# Altium footprint library Zynq-Video-Board.PcbLib: 39 footprints (part 3 of 3)
Each footprint in its own frame and in the unit in brackets; x right, y up, seen from the top. Pads: shape width x height; smd on the part's side, far side on the other; paste and mask are expansions set on the pad; w line width, h text height; cw(c..) or ccw(c..) is an arc to the next point about the centre after c.
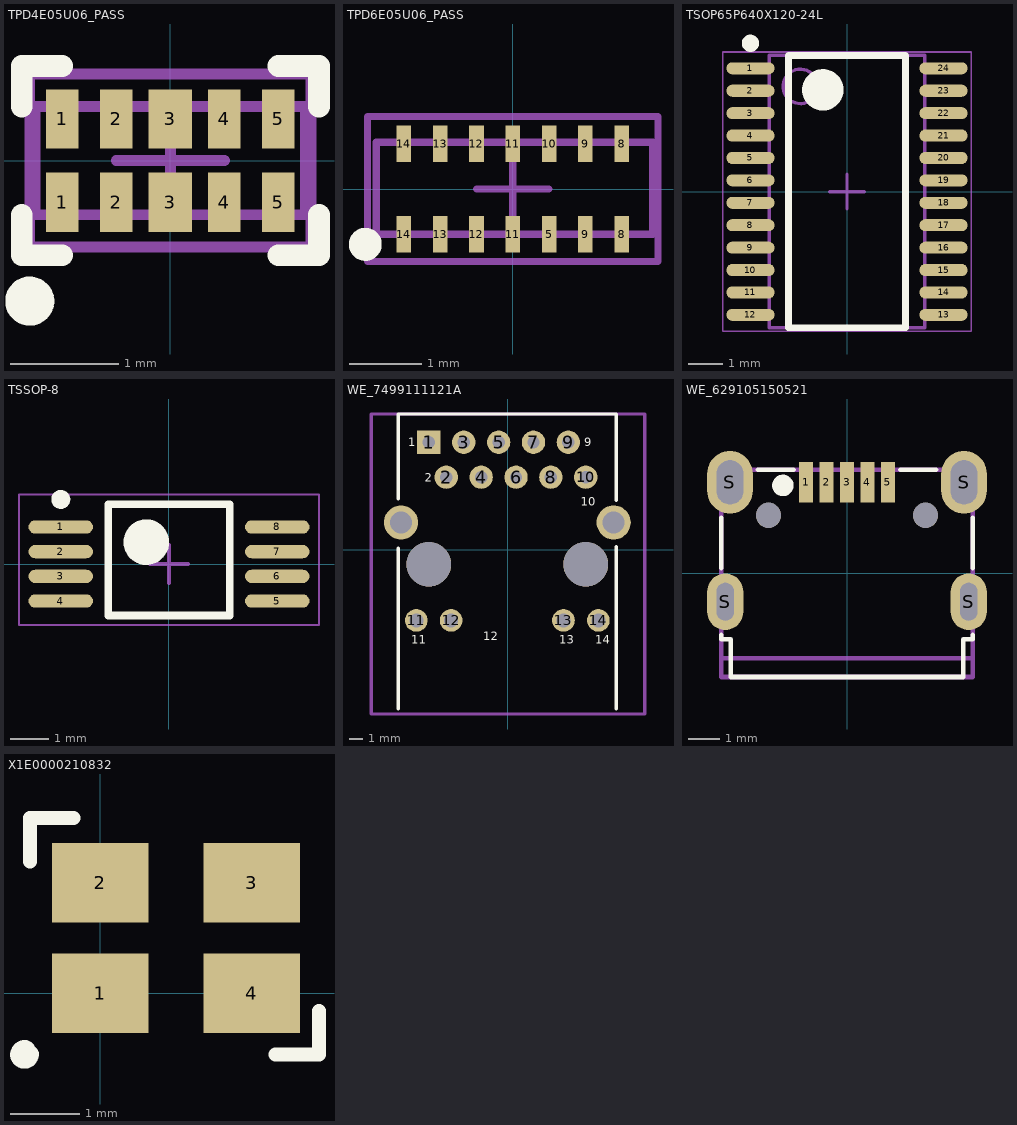
[diagram p2: the footprints below, top view; thin cyan lines are the x and y axes]

## TPD4E05U06_PASS [mm]
pads (10):
  rect 0.3x0.55 smd: 1(-1,-0.385) 1(-1,0.385) 2(-0.5,-0.385) 2(-0.5,0.385) 4(0.5,-0.385) 4(0.5,0.385) 5(1,-0.385) 5(1,0.385)
  rect 0.4x0.55 smd: 3(0,-0.385) 3(0,0.385)
Top Overlay:
  circle w0.254: c-1.3,-1.3 r0.1
  lines w0.2: -1.375,-0.5 -1.375,-0.875 -1,-0.875 ; -1.375,0.5 -1.375,0.875 -1,0.875 ; 1,-0.875 1.375,-0.875 1.375,-0.5 ; 1,0.875 1.375,0.875 1.375,0.5
Mechanical 13:
  lines w0.1: -1.25,-0.5 -1.25,0.5 1.25,0.5 1.25,-0.5 -1.25,-0.5
Mechanical 15:
  lines w0.1: -0.5,0 0.5,0 ; 0,-0.5 0,0.5 ; -1.3,-0.8 1.3,-0.8 1.3,0.8 -1.3,0.8 -1.3,-0.8
3D body: height 0.56, standoff 0.01, extent -1.25,-0.5 1.25,0.51

## TPD6E05U06_PASS [mm]
pads (14):
  rect 0.2x0.5 smd: 5(0.5,-0.625) 8(1.5,-0.625) 8(1.5,0.625) 9(1,-0.625) 9(1,0.625) 10(0.5,0.625) 11(0,-0.625) 11(0,0.625) 12(-0.5,-0.625) 12(-0.5,0.625) 13(-1,-0.625) 13(-1,0.625) 14(-1.5,-0.625) 14(-1.5,0.625)
Top Overlay:
  circle w0.254: c-2.032,-0.762 r0.1
Mechanical 13:
  lines w0.1: -1.881,-0.625 -1.881,0.645 1.929,0.645 1.929,-0.625 -1.881,-0.625
Mechanical 15:
  lines w0.1: -0.5,0 0.5,0 ; 0,-0.5 0,0.5 ; -2,-1 2,-1 2,1 -2,1 -2,-1
3D body: height 0.6, standoff 0.01, extent -1.881,-0.625 1.929,0.645

## TSOP65P640X120-24L [mm]
pads (24):
  oval 1.4x0.35 smd: 1(-2.8,3.575) 2(-2.8,2.925) 3(-2.8,2.275) 4(-2.8,1.625) 5(-2.8,0.975) 6(-2.8,0.325) 7(-2.8,-0.325) 8(-2.8,-0.975) 9(-2.8,-1.625) 10(-2.8,-2.275) 11(-2.8,-2.925) 12(-2.8,-3.575) 13(2.8,-3.575) 14(2.8,-2.925) 15(2.8,-2.275) 16(2.8,-1.625) 17(2.8,-0.975) 18(2.8,-0.325) 19(2.8,0.325) 20(2.8,0.975) 21(2.8,1.625) 22(2.8,2.275) 23(2.8,2.925) 24(2.8,3.575)
Top Overlay:
  circle w0.25: c-2.8,4.3 r0.125
  circle w0.6: c-0.7,2.95 r0.3
  lines w0.2: -1.7,-3.95 -1.7,3.95 1.7,3.95 1.7,-3.95 -1.7,-3.95
Mechanical 13:
  circle w0.1: c-1.35,3.05 r0.5
  lines w0.1: -2.25,-3.95 -2.25,3.95 2.25,3.95 2.25,-3.95 -2.25,-3.95
Mechanical 15:
  lines w0.05: -3.6,-4.05 -3.6,4.05 3.6,4.05 3.6,-4.05 -3.6,-4.05
  lines w0.1: -0.5,0 0.5,0 ; 0,-0.5 0,0.5
3D body: height 1.2, standoff 0, extent -3.275,-3.95 3.275,3.95

## TSSOP-8 [mm]
pads (8):
  oval 1.7x0.35 smd: 1(-2.85,0.975) 2(-2.85,0.325) 3(-2.85,-0.325) 4(-2.85,-0.975) 5(2.85,-0.975) 6(2.85,-0.325) 7(2.85,0.325) 8(2.85,0.975)
Top Overlay:
  circle w0.25: c-2.85,1.7 r0.125
  circle w0.6: c-0.6,0.575 r0.3
  lines w0.2: -1.6,-1.356 -1.6,1.575 1.6,1.575 1.6,-1.356 -1.6,-1.356
Mechanical 3:
  lines w0.05: -3.95,-1.61 3.95,-1.61 3.95,1.825 -3.95,1.825 -3.95,-1.61
  lines w0.1: -0.5,0 0.5,0 ; 0,-0.5 0,0.5
3D body: height 1.21, standoff 0.01, extent -3.2,-1.5 3.2,1.5

## WE_7499111121A [mm]
pads (18):
  rect 1.7x1.7 hole 0.9: 1(-5.755,7.816)
  round 1.7 hole 0.9: 2(-4.485,5.276) 3(-3.215,7.816) 4(-1.945,5.276) 5(-0.675,7.816) 6(0.595,5.276) 7(1.865,7.816) 8(3.135,5.276) 9(4.405,7.816) 10(5.675,5.276)
  round 1.65 hole 1.02: 11(-6.67,-5.154) 12(-4.13,-5.154) 13(4.05,-5.154) 14(6.59,-5.154)
  round 2.5 hole 1.6: ""(-7.785,1.976) ""(7.705,1.976)
  round 3.25 hole 3.25 unplated paste+0: ""(-5.755,-1.074) ""(5.675,-1.074)
Top Overlay:
  lines w0.254: -7.98,-11.6 -7.98,0.1 ; -7.98,3.7 -7.98,9.876 7.9,9.876 7.9,3.6 ; 7.9,-11.6 7.9,0.2
  text "14" at 6.36,-6.874 h0.6
  text "13" at 3.76,-6.874 h0.6
  text "12" at -1.8,-6.6 h0.6
  text "11" at -7.04,-6.874 h0.6
  text "10" at 5.3,3.2 h0.6
  text "9" at 5.56,7.526 h0.6
  text "2" at -6.04,4.926 h0.6
  text "1" at -7.24,7.526 h0.6
Mechanical 13:
  lines w0.254: -9.94,-11.974 9.96,-11.974 9.96,9.876 -9.94,9.876 -9.94,-11.974
3D body: height 3.37, standoff -16.21, extent -10.067,-11.934 9.779,9.906

## WE_629105150521 [mm]
pads (11):
  rect 0.45x1.3 smd: 1(-1.3,2.9) 2(-0.65,2.9) 3(0,2.9) 4(0.65,2.9) 5(1.3,2.9)
  oval 1.15x1.8 hole 0.55 slot 1.2 at 90 deg: S(-3.875,-0.9) S(3.875,-0.9)
  oval 1.45x2 hole 0.85 slot 1.4 at 90 deg: S(-3.725,2.9) S(3.725,2.9)
  round 0.8 hole 0.8 unplated: ""(-2.5,1.85) ""(2.5,1.85)
Top Overlay:
  circle w0.4: c-2.041,2.8 r0.141
  lines w0.15: -4,-1.96 -4,-2.1 -3.7,-2.1 -3.7,-3.3 3.7,-3.3 3.7,-2.1 4,-2.1 4,-1.96 ; -4,0.17 -4,1.77 ; -2.83,3.3 -1.7,3.3 ; 1.7,3.3 2.83,3.3 ; 4,0.17 4,1.77
Mechanical 13:
  lines w0.15: -4,-3.3 -4,3.3 4,3.3 4,-3.3 -4,-3.3
Mechanical 15:
  lines w0.15: -4,-2.7 4,-2.7
  text "PCB Edge" at -1.9,-2.4 h1
3D body: height 2.71, standoff -0.85, extent -4,-3.3 4,3.303

## X1E0000210832 [mm]
pads (4):
  rect 1.4x1.15 smd: 1(0,0) 2(0,1.6) 3(2.2,1.6) 4(2.2,0)
Top Overlay:
  lines w0.2: -1.016,1.905 -1.016,2.54 -0.381,2.54 ; 2.54,-0.889 3.175,-0.889 3.175,-0.254
  lines w0.254: -1.06,-0.817 ccw(c-1.096,-0.889) -1.016,-0.889
3D body: height 0.8, standoff 0, extent -0.507,-0.538 2.793,2.062